# Altium footprint library biblioteka_pcb.PcbLib: 184 footprints (part 12 of 12)
Each footprint in its own frame and in the unit in brackets; x right, y up, seen from the top. Pads: shape width x height; smd on the part's side, far side on the other; paste and mask are expansions set on the pad; w line width, h text height; cw(c..) or ccw(c..) is an arc to the next point about the centre after c.
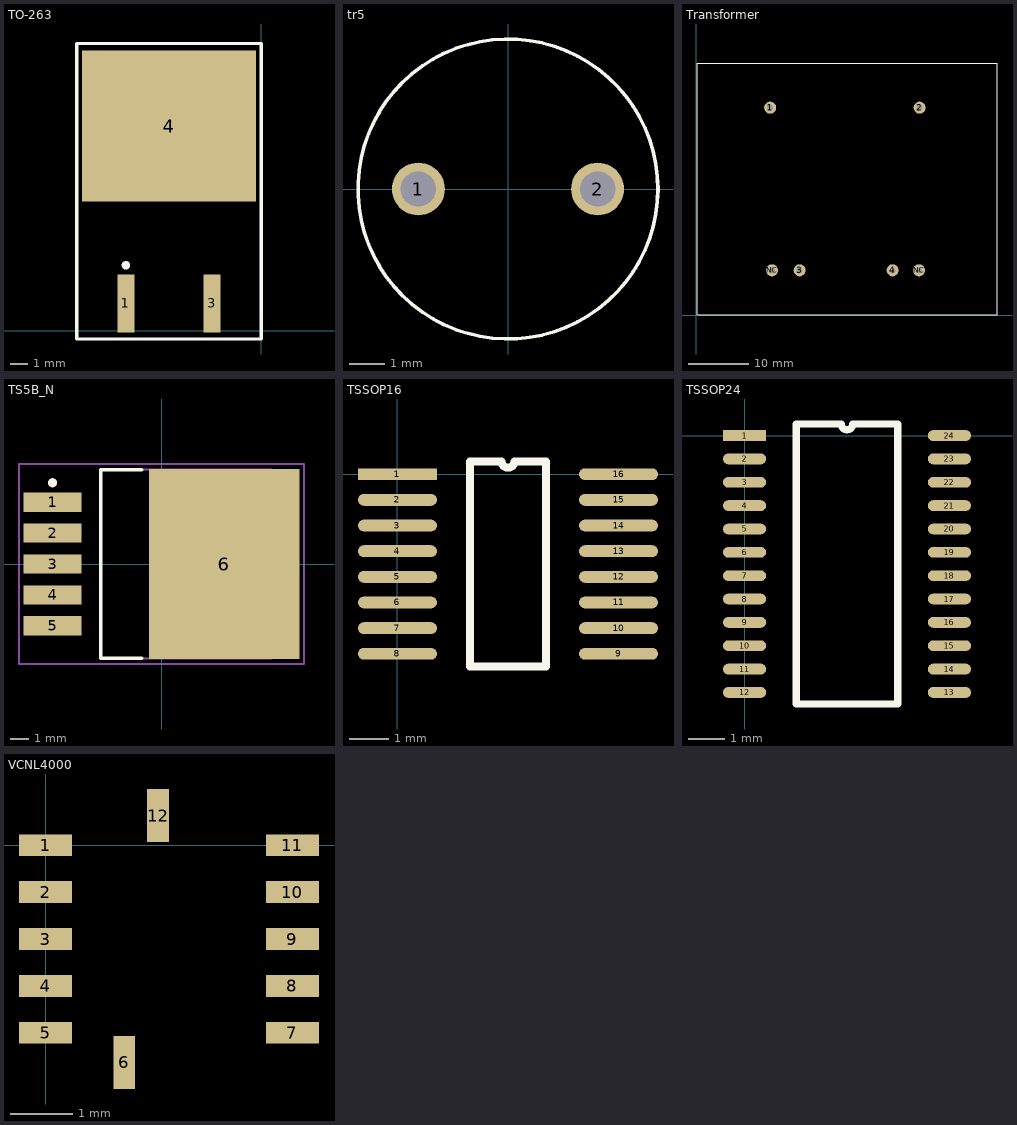
[diagram p11: the footprints below, top view; thin cyan lines are the x and y axes]

## TO-252 [mm]

## TO-263 [mm] "D2-PAK/TO-263-AB; 3 Leads (1 Cropped); Body 15.9 (inc. leads) x 10.4 mm (LxW max)"
height 4.6
pads (3):
  rect 1x3.4 smd: 1(-7.965,1.6) 3(-2.885,1.6)
  rect 10.25x8.9 smd: 4(-5.425,12.05)
Top Overlay:
  circle w0.25: c-7.965,3.85 r0.125
  lines w0.2: -0.055,-0.491 -10.85,-0.491 -10.85,0 -10.85,16.4 -10.85,16.908 -0.055,16.908 ; 0,-0.491 0,0 0,16.4 0,16.908
3D body "TO263.stp": height 4.5, standoff 0, extent -10.4,0.35 -0.4,15.65

## tr5 [mm] "littlefuse_tr5"
pads (2):
  round 1.5 hole 1: 1(-2.54,0) 2(2.54,0)
Top Overlay:
  circle w0.1: c0,0 r4.25
3D body: height 4, standoff 0, extent 2.052,-0.5 3.048,0.498
3D body: height 4, standoff 0, extent -3.05,-0.5 -2.054,0.498
3D body: height 9, standoff 4, extent -4.25,-4.25 4.216,4.233

## Transformer [mm] "230/12 830mA 50x42mm"
pads (6):
  round 2 hole 1: 1(12.3,34.6) 2(37.2,34.6) 3(17.2,7.5) 4(32.7,7.5) NC(12.6,7.5) NC(37.1,7.5)
Top Overlay:
  lines w0.2: 0.1,0.1 0.1,42 50.1,42 50.1,0.1 0.2,0.1

## TS5B_N [mm] "D2-PAK, 6-Leads, Body 8.6x10.2mm, Pitch 1.7mm, Lead Span 14.1mm, IPC Medium Density"
height 4.65
pads (6):
  rect 3.2x1.05 smd: 1(-6,3.4) 2(-6,1.7) 3(-6,0) 4(-6,-1.7) 5(-6,-3.4)
  rect 8.3x10.45 smd: 6(3.45,0)
Top Overlay:
  circle w0.25: c-6,4.475 r0.125
  lines w0.2: -1.1,-5.2 -3.35,-5.2 -3.35,5.2 -1.1,5.2
Mechanical 13:
  lines w0.1: -3.35,-5.2 -3.35,5.2 6.05,5.2 6.05,-5.2 -3.35,-5.2
Mechanical 15:
  lines w0.1: -0.5,0 0.5,0 ; 0,-0.5 0,0.5 ; -7.85,-5.5 -7.85,5.5 7.85,5.5 7.85,-5.5 -7.85,-5.5
3D body "TO263.stp": height 4.5, standoff 0, extent -7.075,-5 7.275,5

## TSSOP16 [mm]
pads (16):
  rect 2x0.3 smd: 1(0,0)
  oval 2x0.3 smd: 2(0,-0.65) 3(0,-1.3) 4(0,-1.95) 5(0,-2.6) 6(0,-3.25) 7(0,-3.9) 8(0,-4.55) 9(5.6,-4.55) 10(5.6,-3.9) 11(5.6,-3.25) 12(5.6,-2.6) 13(5.6,-1.95) 14(5.6,-1.3) 15(5.6,-0.65) 16(5.6,0)
Top Overlay:
  lines w0.2: 1.835,-4.875 3.765,-4.875 3.765,0.325 2.962,0.325 cw(c2.8,0.325) 2.638,0.325 1.835,0.325 1.835,-4.875
3D body "TSSOP16.stp": height 1.2, standoff 0, extent -0.4,-4.8 6,0.2

## TSSOP24 [mm]
pads (24):
  rect 1.2x0.3 smd: 1(0,0)
  oval 1.2x0.3 smd: 2(0,-0.65) 3(0,-1.3) 4(0,-1.95) 5(0,-2.6) 6(0,-3.25) 7(0,-3.9) 8(0,-4.55) 9(0,-5.2) 10(0,-5.85) 11(0,-6.5) 12(0,-7.15) 13(5.7,-7.15) 14(5.7,-6.5) 15(5.7,-5.85) 16(5.7,-5.2) 17(5.7,-4.55) 18(5.7,-3.9) 19(5.7,-3.25) 20(5.7,-2.6) 21(5.7,-1.95) 22(5.7,-1.3) 23(5.7,-0.65) 24(5.7,0)
Top Overlay:
  lines w0.2: 1.435,-7.475 1.435,0.325 2.688,0.325 ccw(c2.85,0.325) 3.012,0.325 4.265,0.325 4.265,-7.475 1.435,-7.475
3D body "TSSOP24.stp": height 1.2, standoff 0, extent -0.406,-7.506 5.994,0.394

## VCNL4000 [mm]
pads (12):
  rect 0.85x0.35 smd: 1(0,0) 2(0,-0.75) 3(0,-1.5) 4(0,-2.25) 5(0,-3) 7(3.95,-3) 8(3.95,-2.25) 9(3.95,-1.5) 10(3.95,-0.75) 11(3.95,0)
  rect 0.35x0.85 smd: 6(1.26,-3.475) 12(1.8,0.475)
3D body "vcnl4000.stp": height 0.85, standoff 0, extent 0,-3.442 3.95,0.508